# Altium footprint library WR-TBL_Rising Cage Clamp.PcbLib: 435 footprints (part 5 of 28)
Each footprint in its own frame and in the unit in brackets; x right, y up, seen from the top. Pads: shape width x height; smd on the part's side, far side on the other; paste and mask are expansions set on the pad; w line width, h text height; cw(c..) or ccw(c..) is an arc to the next point about the centre after c.
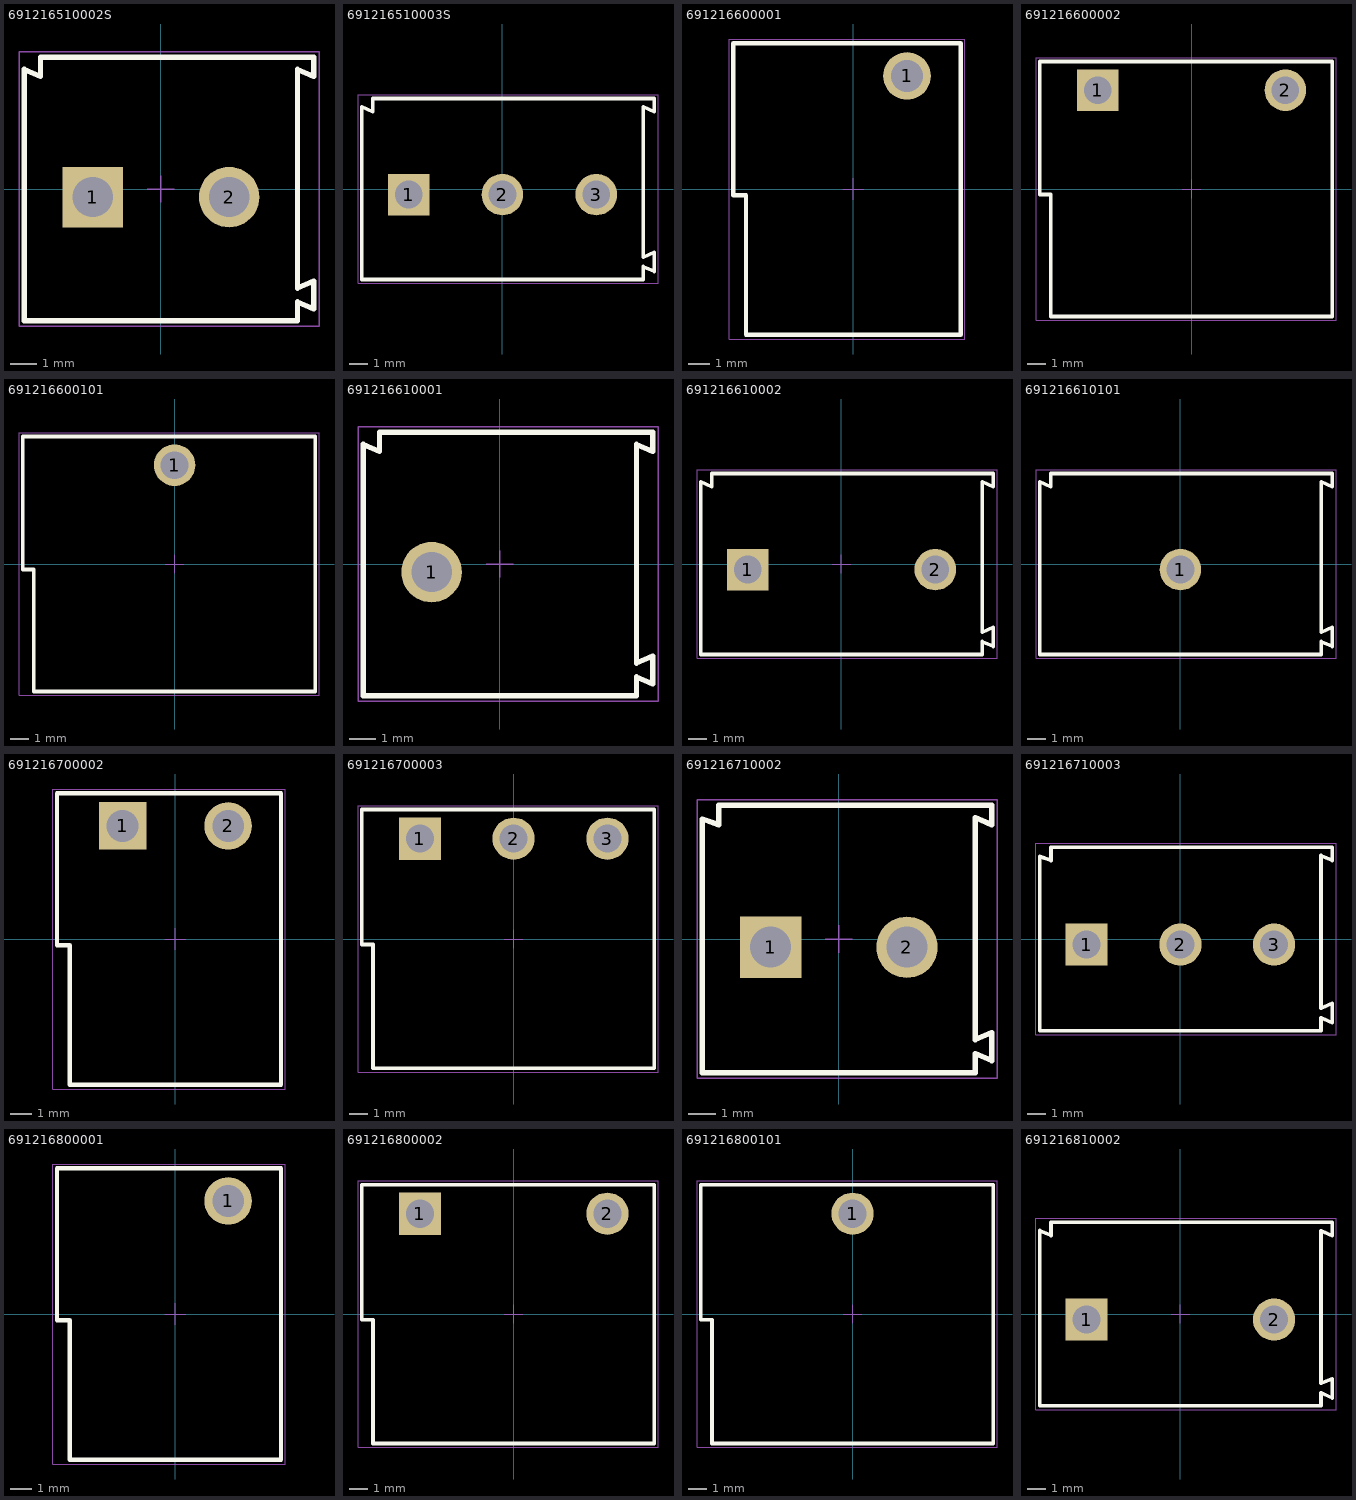
[diagram p4: the footprints below, top view; thin cyan lines are the x and y axes]

## 691216510002S [mm] "Serie 2165S - 5.08 mm _ 2 pins"
height 13.8
pads (2):
  rect 2.25x2.25 hole 1.5: 1(-2.54,-0.3)
  round 2.25 hole 1.5: 2(2.54,-0.3)
Top Overlay:
  lines w0.2: -4.48,4.19 -4.48,4.9 5.68,4.9 5.68,4.19 ; -4.48,4.19 -5.08,4.45 -5.08,-4.9 5.08,-4.9 5.08,-4.2 5.68,-4.461 5.68,-3.43 5.08,-3.691 5.08,4.45 5.679,4.188
Mechanical 13:
  lines w0.1: -4.48,4.19 -4.48,4.9 5.68,4.9 5.68,4.19 ; -4.48,4.19 -5.08,4.45 -5.08,-4.9 5.08,-4.9 5.08,-4.2 5.68,-4.461 5.68,-3.43 5.08,-3.691 5.08,4.45 5.679,4.188
Mechanical 15:
  lines w0.05: -0.5,0 0.5,0 ; 0,-0.5 0,0.5 ; -5.28,-5.1 -5.28,5.1 5.88,5.1 5.88,-5.1 -5.28,-5.1
3D body "691216510002S.stp": height 13.85, standoff -3.45, extent -5.08,-4.9 5.68,4.9

## 691216510003S [mm] "Serie 2165S - 5.08 mm _ 3 pins"
height 13.8
pads (3):
  rect 2.25x2.25 hole 1.5: 1(-5.08,-0.3)
  round 2.25 hole 1.5: 2(0,-0.3) 3(5.08,-0.3)
Top Overlay:
  lines w0.2: -7.02,4.19 -7.02,4.9 8.22,4.9 8.22,4.19 ; -7.02,4.19 -7.62,4.45 -7.62,-4.9 7.62,-4.9 7.62,-4.2 8.22,-4.461 8.22,-3.43 7.62,-3.691 7.62,4.45 8.219,4.188
Mechanical 13:
  lines w0.1: -7.02,4.19 -7.02,4.9 8.22,4.9 8.22,4.19 ; -7.02,4.19 -7.62,4.45 -7.62,-4.9 7.62,-4.9 7.62,-4.2 8.22,-4.461 8.22,-3.43 7.62,-3.691 7.62,4.45 8.219,4.188
Mechanical 15:
  lines w0.05: -0.5,0 0.5,0 ; 0,-0.5 0,0.5 ; -7.82,-5.1 8.42,-5.1 8.42,5.1 -7.82,5.1 -7.82,-5.1
3D body "691216510003S.stp": height 13.85, standoff -3.45, extent -7.62,-4.9 8.22,4.9

## 691216600001 [mm] "Vertical Cable Entry with Rising Cage Clamp, pitch 10.16mm, 01p"
height 9.8
pads (1):
  round 2.25 hole 1.5: 1(2.54,5.35)
Top Overlay:
  lines w0.2: -5.68,-0.3 -5.08,-0.3 -5.08,-6.9 5.08,-6.9 5.08,6.9 -5.68,6.9 -5.68,-0.3
Mechanical 13:
  lines w0.1: -5.68,-0.3 -5.68,6.9 5.08,6.9 5.08,-6.9 -5.08,-6.9 -5.08,-0.3 -5.68,-0.3
Mechanical 15:
  lines w0.05: -0.5,0 0.5,0 ; 0,-0.5 0,0.5 ; -5.88,-7.1 5.28,-7.1 5.28,7.1 -5.88,7.1 -5.88,-7.1
3D body "691216600001.stp": height 9.9, standoff -3.4, extent -5.68,-6.9 5.08,6.9

## 691216600002 [mm] "Vertical Cable Entry with Rising Cage Clamp, pitch 10.16mm, 02p"
height 9.8
pads (2):
  rect 2.25x2.25 hole 1.5: 1(-5.08,5.35)
  round 2.25 hole 1.5: 2(5.08,5.35)
Top Overlay:
  lines w0.2: -8.22,-0.3 -7.62,-0.3 -7.62,-6.9 7.62,-6.9 7.62,6.9 -8.22,6.9 -8.22,-0.3
Mechanical 13:
  lines w0.1: -8.22,-0.3 -8.22,6.9 7.62,6.9 7.62,-6.9 -7.62,-6.9 -7.62,-0.3 -8.22,-0.3
Mechanical 15:
  lines w0.05: -0.5,0 0.5,0 ; 0,-0.5 0,0.5 ; -8.42,-7.1 7.82,-7.1 7.82,7.1 -8.42,7.1 -8.42,-7.1
3D body "691216600002.stp": height 9.9, standoff -3.4, extent -8.22,-6.9 7.62,6.9

## 691216600101 [mm] "Vertical Cable Entry with Rising Cage Clamp, pitch 10.16mm, 01p"
height 9.8
pads (1):
  round 2.25 hole 1.5: 1(0,5.35)
Top Overlay:
  lines w0.2: -8.22,-0.3 -7.62,-0.3 -7.62,-6.9 7.62,-6.9 7.62,6.9 -8.22,6.9 -8.22,-0.3
Mechanical 13:
  lines w0.1: -8.22,-0.3 -8.22,6.9 7.62,6.9 7.62,-6.9 -7.62,-6.9 -7.62,-0.3 -8.22,-0.3
Mechanical 15:
  lines w0.05: -0.5,0 0.5,0 ; 0,-0.5 0,0.5 ; -8.42,-7.1 7.82,-7.1 7.82,7.1 -8.42,7.1 -8.42,-7.1
3D body "691216600101.stp": height 9.9, standoff -3.4, extent -8.22,-6.9 7.62,6.9

## 691216610001 [mm] "Horizontal Cable Entry with Rising Cage Clamp, pitch 10.16mm, 01p"
height 13.8
pads (1):
  round 2.25 hole 1.5: 1(-2.54,-0.3)
Top Overlay:
  lines w0.2: -4.481,4.188 -5.08,4.45 -5.08,-4.9 5.08,-4.9 5.08,-4.2 5.679,-4.462 ; -4.48,4.19 -4.48,4.9 5.68,4.9 5.68,4.19 5.08,4.45 5.08,-3.69 5.679,-3.428 ; 5.68,-4.46 5.68,-3.43
Mechanical 13:
  lines w0.1: -4.481,4.188 -5.08,4.45 -5.08,-4.9 5.08,-4.9 5.08,-4.2 5.679,-4.462 ; -4.48,4.19 -4.48,4.9 5.68,4.9 5.68,4.19 5.08,4.45 5.08,-3.69 5.679,-3.428 ; 5.68,-4.46 5.68,-3.43
Mechanical 15:
  lines w0.05: -0.5,0 0.5,0 ; 0,-0.5 0,0.5 ; -5.28,-5.1 5.88,-5.1 5.88,5.1 -5.28,5.1 -5.28,-5.1
3D body "691216610001.stp": height 13.9, standoff -3.4, extent -5.08,-4.9 5.68,4.9

## 691216610002 [mm] "Horizontal Cable Entry with Rising Cage Clamp, pitch 10.16mm, 02p"
height 13.8
pads (2):
  rect 2.25x2.25 hole 1.5: 1(-5.08,-0.3)
  round 2.25 hole 1.5: 2(5.08,-0.3)
Top Overlay:
  lines w0.2: -7.021,4.188 -7.62,4.45 -7.62,-4.9 7.62,-4.9 7.62,-4.2 8.219,-4.462 ; -7.02,4.19 -7.02,4.9 8.22,4.9 8.22,4.19 7.62,4.45 7.62,-3.69 8.219,-3.428 ; 8.22,-4.46 8.22,-3.43
Mechanical 13:
  lines w0.1: -7.021,4.188 -7.62,4.45 -7.62,-4.9 7.62,-4.9 7.62,-4.2 8.219,-4.462 ; -7.02,4.19 -7.02,4.9 8.22,4.9 8.22,4.19 7.62,4.45 7.62,-3.69 8.219,-3.428 ; 8.22,-4.46 8.22,-3.43
Mechanical 15:
  lines w0.05: -0.5,0 0.5,0 ; 0,-0.5 0,0.5 ; -7.82,-5.1 8.42,-5.1 8.42,5.1 -7.82,5.1 -7.82,-5.1
3D body "691216610002.stp": height 13.9, standoff -3.4, extent -7.62,-4.9 8.22,4.9

## 691216610101 [mm] "Horizontal Cable Entry with Rising Cage Clamp, pitch 10.16mm, 01p"
height 13.8
pads (1):
  round 2.25 hole 1.5: 1(0,-0.3)
Top Overlay:
  lines w0.2: -7.021,4.188 -7.62,4.45 -7.62,-4.9 7.62,-4.9 7.62,-4.2 8.219,-4.462 ; -7.02,4.19 -7.02,4.9 8.22,4.9 8.22,4.19 7.62,4.45 7.62,-3.69 8.219,-3.428 ; 8.22,-4.46 8.22,-3.43
Mechanical 13:
  lines w0.1: -7.021,4.188 -7.62,4.45 -7.62,-4.9 7.62,-4.9 7.62,-4.2 8.219,-4.462 ; -7.02,4.19 -7.02,4.9 8.22,4.9 8.22,4.19 7.62,4.45 7.62,-3.69 8.219,-3.428 ; 8.22,-4.46 8.22,-3.43
Mechanical 15:
  lines w0.05: -0.5,0 0.5,0 ; 0,-0.5 0,0.5 ; -7.82,-5.1 -7.82,5.1 8.42,5.1 8.42,-5.1 -7.82,-5.1
3D body "691216610101.stp": height 13.9, standoff -3.4, extent -7.62,-4.9 8.22,4.9

## 691216700002 [mm] "Serie 2167 - 5.00 mm _ 2 pins"
height 9.8
pads (2):
  rect 2.25x2.25 hole 1.5: 1(-2.5,5.35)
  round 2.25 hole 1.5: 2(2.5,5.35)
Top Overlay:
  lines w0.2: -5.6,-0.3 -5.6,6.9 5,6.9 5,-6.9 -5,-6.9 -5,-0.3 -5.6,-0.3
Mechanical 13:
  lines w0.1: -5.6,-0.3 -5,-0.3 -5,-6.9 5,-6.9 5,6.9 -5.6,6.9 -5.6,-0.3
Mechanical 15:
  lines w0.05: -0.5,0 0.5,0 ; 0,-0.5 0,0.5 ; -5.8,-7.1 5.2,-7.1 5.2,7.1 -5.8,7.1 -5.8,-7.1
3D body "691216700002.stp": height 9.9, standoff -3.4, extent -5.6,-6.9 5,6.9

## 691216700003 [mm] "Serie 2167 - 5.00 mm _ 3 pins"
height 9.8
pads (3):
  rect 2.25x2.25 hole 1.5: 1(-5,5.35)
  round 2.25 hole 1.5: 2(0,5.35) 3(5,5.35)
Top Overlay:
  lines w0.2: -8.1,-0.3 -7.5,-0.3 -7.5,-6.9 7.5,-6.9 7.5,6.9 -8.1,6.9 -8.1,-0.3
Mechanical 13:
  lines w0.1: -8.1,-0.3 -8.1,6.9 7.5,6.9 7.5,-6.9 -7.5,-6.9 -7.5,-0.3 -8.1,-0.3
Mechanical 15:
  lines w0.05: -0.5,0 0.5,0 ; 0,-0.5 0,0.5 ; -8.3,-7.1 -8.3,7.1 7.7,7.1 7.7,-7.1 -8.3,-7.1
3D body "691216700003.stp": height 9.9, standoff -3.4, extent -8.1,-6.9 7.5,6.9

## 691216710002 [mm] "Serie 2167 - 5.00 mm _ 2 pins"
height 13.8
pads (2):
  rect 2.25x2.25 hole 1.5: 1(-2.5,-0.3)
  round 2.25 hole 1.5: 2(2.5,-0.3)
Top Overlay:
  lines w0.2: -5,-4.9 5,-4.9 5,-4.2 5.6,-4.46 5.6,-3.43 5,-3.69 5,4.45 5.6,4.19 5.6,4.9 -4.4,4.9 -4.4,4.19 -5,4.4 -5,-4.9
Mechanical 13:
  lines w0.1: -5,-4.9 -5,4.4 -4.4,4.19 -4.4,4.9 5.6,4.9 5.6,4.19 5,4.45 5,-3.69 5.6,-3.43 5.6,-4.46 5,-4.2 5,-4.9 -5,-4.9
Mechanical 15:
  lines w0.05: -0.5,0 0.5,0 ; 0,-0.5 0,0.5 ; -5.2,-5.1 5.8,-5.1 5.8,5.1 -5.2,5.1 -5.2,-5.1
3D body "691216710002.stp": height 13.85, standoff -3.45, extent -5,-4.9 5.6,4.9

## 691216710003 [mm] "Serie 2167 - 5.00 mm _ 3 pins"
height 13.8
pads (3):
  rect 2.25x2.25 hole 1.5: 1(-5,-0.3)
  round 2.25 hole 1.5: 2(0,-0.3) 3(5,-0.3)
Top Overlay:
  lines w0.2: -7.5,-4.9 7.5,-4.9 7.5,-4.2 8.1,-4.46 8.1,-3.43 7.5,-3.69 7.5,4.45 8.1,4.19 8.1,4.9 -6.9,4.9 -6.9,4.19 -7.5,4.4 -7.5,-4.9
Mechanical 13:
  lines w0.1: -7.5,-4.9 -7.5,4.4 -6.9,4.19 -6.9,4.9 8.1,4.9 8.1,4.19 7.5,4.45 7.5,-3.69 8.1,-3.43 8.1,-4.46 7.5,-4.2 7.5,-4.9 -7.5,-4.9
Mechanical 15:
  lines w0.05: -0.5,0 0.5,0 ; 0,-0.5 0,0.5 ; -7.7,-5.1 8.3,-5.1 8.3,5.1 -7.7,5.1 -7.7,-5.1
3D body "691216710003.stp": height 13.85, standoff -3.45, extent -7.5,-4.9 8.1,4.9

## 691216800001 [mm] "Vertical Cable Entry with Rising Cage Clamp, pitch 10mm, 01p"
height 9.8
pads (1):
  round 2.25 hole 1.5: 1(2.5,5.35)
Top Overlay:
  lines w0.2: -5.6,-0.3 -5.6,6.9 5,6.9 5,-6.9 -5,-6.9 -5,-0.3 -5.6,-0.3
Mechanical 13:
  lines w0.1: -5.6,-0.3 -5,-0.3 -5,-6.9 5,-6.9 5,6.9 -5.6,6.9 -5.6,-0.3
Mechanical 15:
  lines w0.05: -0.5,0 0.5,0 ; 0,-0.5 0,0.5 ; -5.8,-7.1 5.2,-7.1 5.2,7.1 -5.8,7.1 -5.8,-7.1
3D body "691216800001.stp": height 9.9, standoff -3.4, extent -5.6,-6.9 5,6.9

## 691216800002 [mm] "Vertical Cable Entry with Rising Cage Clamp, pitch 10mm, 02p"
height 9.8
pads (2):
  rect 2.25x2.25 hole 1.5: 1(-5,5.35)
  round 2.25 hole 1.5: 2(5,5.35)
Top Overlay:
  lines w0.2: -8.1,-0.3 -8.1,6.9 7.5,6.9 7.5,-6.9 -7.5,-6.9 -7.5,-0.3 -8.1,-0.3
Mechanical 13:
  lines w0.1: -8.1,-0.3 -7.5,-0.3 -7.5,-6.9 7.5,-6.9 7.5,6.9 -8.1,6.9 -8.1,-0.3
Mechanical 15:
  lines w0.05: -0.5,0 0.5,0 ; 0,-0.5 0,0.5 ; -8.3,-7.1 7.7,-7.1 7.7,7.1 -8.3,7.1 -8.3,-7.1
3D body "691216800002.stp": height 9.9, standoff -3.4, extent -8.1,-6.9 7.5,6.9

## 691216800101 [mm] "Vertical Cable Entry with Rising Cage Clamp, pitch 10mm, 01p"
height 9.8
pads (1):
  round 2.25 hole 1.5: 1(0,5.35)
Top Overlay:
  lines w0.2: -8.1,-0.3 -8.1,6.9 7.5,6.9 7.5,-6.9 -7.5,-6.9 -7.5,-0.3 -8.1,-0.3
Mechanical 13:
  lines w0.1: -8.1,-0.3 -7.5,-0.3 -7.5,-6.9 7.5,-6.9 7.5,6.9 -8.1,6.9 -8.1,-0.3
Mechanical 15:
  lines w0.05: -0.5,0 0.5,0 ; 0,-0.5 0,0.5 ; -8.3,-7.1 7.7,-7.1 7.7,7.1 -8.3,7.1 -8.3,-7.1
3D body "691216800101.stp": height 9.9, standoff -3.4, extent -8.1,-6.9 7.5,6.9

## 691216810002 [mm] "Serie 2168 - 10.00 mm _ 2 pins"
height 13.8
pads (2):
  rect 2.25x2.25 hole 1.5: 1(-5,-0.3)
  round 2.25 hole 1.5: 2(5,-0.3)
Top Overlay:
  lines w0.2: 7.5,4.44 8.1,4.18 8.1,4.9 -6.9,4.9 -6.9,4.19 -7.5,4.45 -7.5,-4.9 7.5,-4.9 7.5,-4.2 ; 7.5,-4.199 8.1,-4.48 8.1,-3.462 7.5,-3.69 7.5,4.44
Mechanical 13:
  lines w0.1: 7.5,4.44 8.1,4.18 8.1,4.9 -6.9,4.9 -6.9,4.19 -7.5,4.45 -7.5,-4.9 7.5,-4.9 7.5,-4.2 ; 7.5,-4.199 8.1,-4.48 8.1,-3.462 7.5,-3.69 7.5,4.44
Mechanical 15:
  lines w0.05: -0.5,0 0.5,0 ; 0,-0.5 0,0.5 ; -7.7,-5.1 8.3,-5.1 8.3,5.1 -7.7,5.1 -7.7,-5.1
3D body "691216810002.stp": height 13.85, standoff -3.45, extent -7.5,-4.9 8.1,4.9